# Altium footprint library ICs And Semiconductors SMD.PcbLib: 602 footprints (part 3 of 38)
Each footprint in its own frame and in the unit in brackets; x right, y up, seen from the top. Pads: shape width x height; smd on the part's side, far side on the other; paste and mask are expansions set on the pad; w line width, h text height; cw(c..) or ccw(c..) is an arc to the next point about the centre after c.
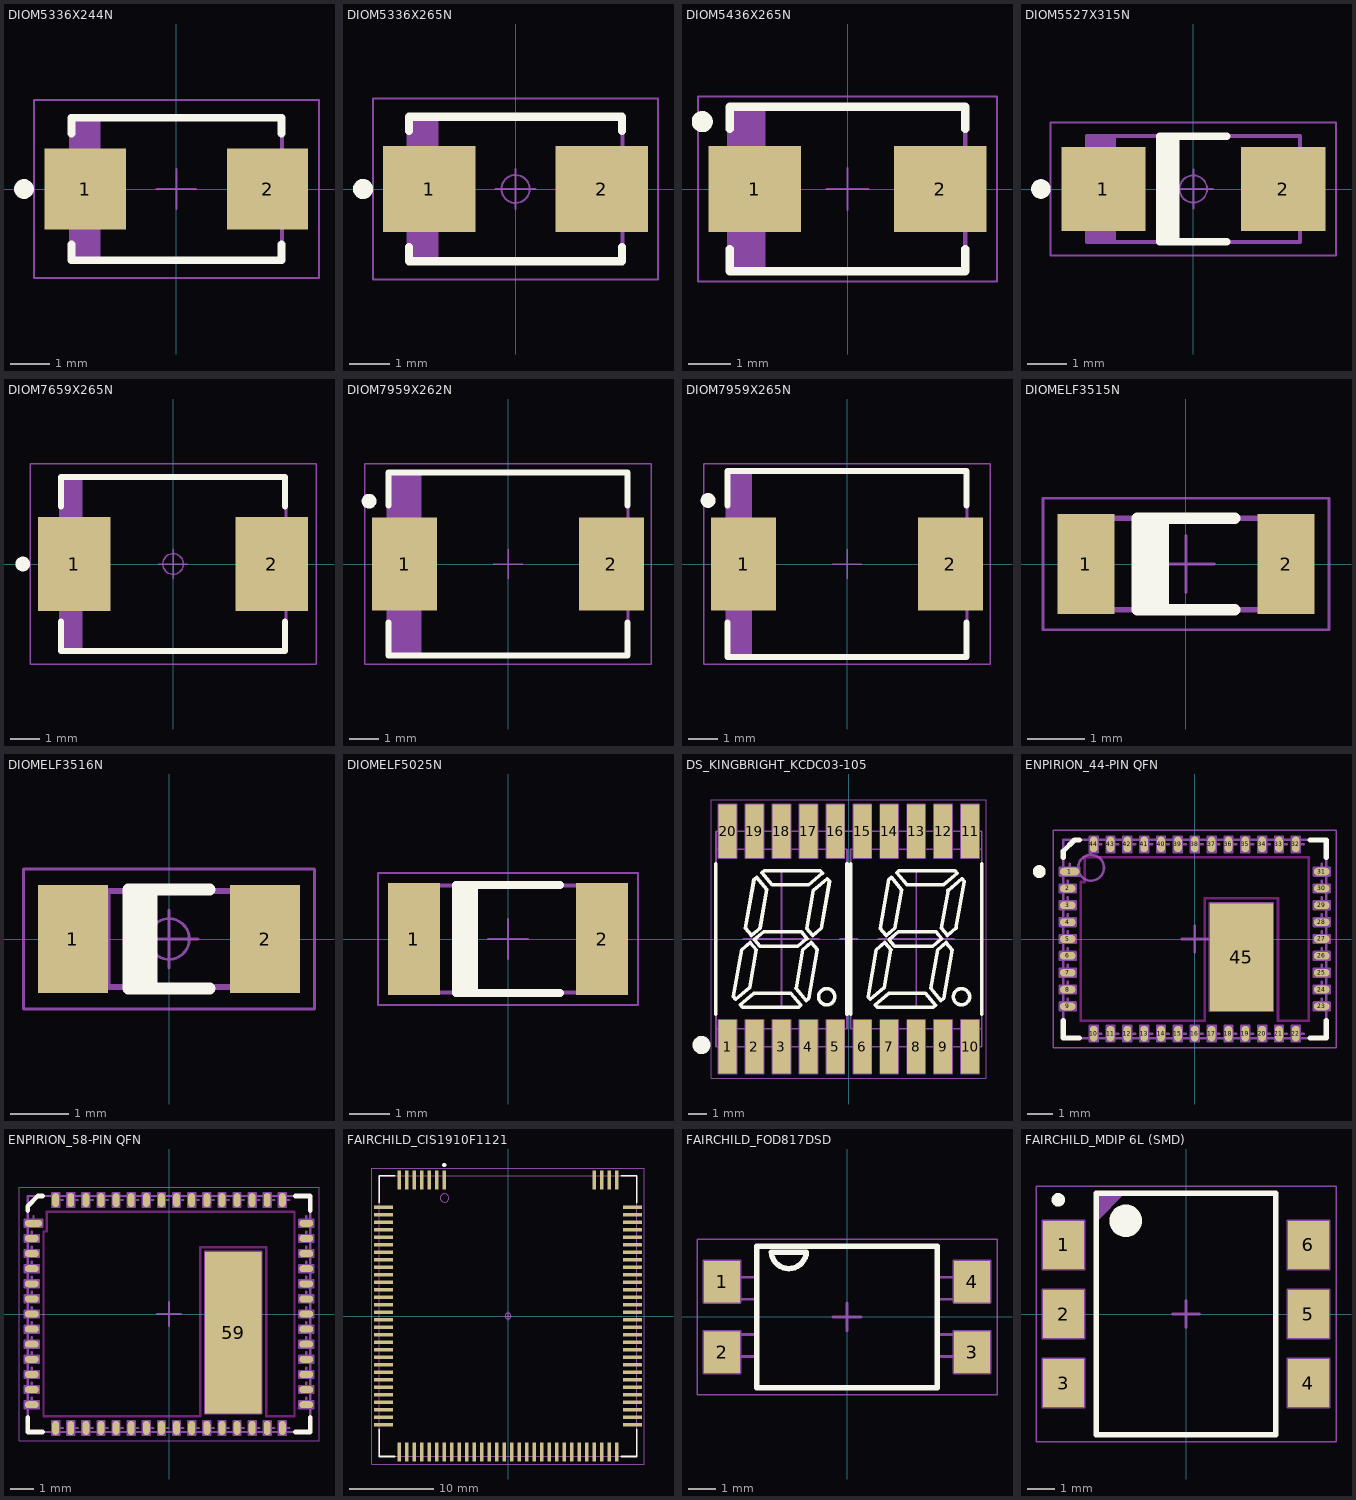
[diagram p2: the footprints below, top view; thin cyan lines are the x and y axes]

## DIOM5336X244N [mm] "DO-214-AA/SMB Molded Diode, 2-Leads, Body 5.3x3.6mm, IPC Medium Density"
height 2.44
pads (2):
  rect 2.05x2.05 smd: 1(-2.3,0) 2(2.3,0)
Top Overlay:
  circle w0.25: c-3.85,0 r0.125
  lines w0.2: -2.65,-1.4 -2.65,-1.8 2.65,-1.8 2.65,-1.4 ; -2.65,1.4 -2.65,1.8 2.65,1.8 2.65,1.4
Mechanical 14:
  lines w0.1: -2.568,-1.81 -2.568,1.81 ; -2.468,-1.81 -2.468,1.81 ; -2.368,-1.81 -2.368,1.81 ; -2.268,-1.81 -2.268,1.81 ; -2.168,-1.81 -2.168,1.81 ; -2.068,-1.81 -2.068,1.81 ; -1.968,-1.81 -1.968,1.81 ; -2.668,-1.81 2.668,-1.81 2.668,1.81 -2.668,1.81 -2.668,-1.81
Mechanical 15:
  lines w0.05: -0.5,0 0.5,0 ; 0,-0.5 0,0.5 ; -3.6,-2.25 3.6,-2.25 3.6,2.25 -3.6,2.25 -3.6,-2.25
3D body "DIOM5336X244N.stp": height 2.44, standoff 0, extent -2.7,-1.95 2.7,1.95

## DIOM5336X265N [mm] "DO-214-AA/SMB Diode, Molded Body; 5.34mm L X 3.625mm W X 2.65mm H, IPC Medium Density"
height 2.65
pads (2):
  rect 2.3x2.15 smd: 1(-2.15,0) 2(2.15,0)
Top Overlay:
  circle w0.25: c-3.8,0 r0.125
  lines w0.2: -2.65,-1.45 -2.65,-1.8 2.65,-1.8 2.65,-1.45 ; -2.65,1.45 -2.65,1.8 2.65,1.8 2.65,1.45
Mechanical 14:
  lines w0.1: -2.57,-1.812 -2.57,1.812 ; -2.47,-1.812 -2.47,1.812 ; -2.37,-1.812 -2.37,1.812 ; -2.27,-1.812 -2.27,1.812 ; -2.17,-1.812 -2.17,1.812 ; -2.07,-1.812 -2.07,1.812 ; -1.97,-1.812 -1.97,1.812 ; -2.67,-1.812 2.67,-1.812 2.67,1.812 -2.67,1.812 ; -2.67,-1.812 -2.67,1.812 ; -2.67,-1.812 -2.67,1.812
Mechanical 15:
  circle w0.05: c0,0 r0.35
  lines w0.05: -0.5,0 0.5,0 ; 0,-0.5 0,0.5 ; -3.55,-2.25 3.55,-2.25 3.55,2.25 -3.55,2.25 -3.55,-2.25
3D body "DIOM5336X240N.stp": height 2.4, standoff 0, extent -2.7,-1.95 2.7,1.95

## DIOM5436X265N [mm] "DO-214-AA/SMB Molded Diode, Body 5.4x3.6mm, IPC Medium Density"
height 2.65
pads (2):
  rect 2.2x2.05 smd: 1(-2.2,0) 2(2.2,0)
Top Overlay:
  circle w0.25: c-3.45,1.6 r0.125
  lines w0.2: -2.8,-1.425 -2.8,-1.95 2.8,-1.95 2.8,-1.425 ; -2.8,1.425 -2.8,1.95 2.8,1.95 2.8,1.425
Mechanical 13:
  lines w0.001: -2.845,-1.97 -2.845,1.97 2.845,1.97 2.845,-1.97 -2.845,-1.97 ; -2.795,-1.95 2.795,-1.95 2.795,1.95 -2.795,1.95 -2.795,-1.95
Mechanical 14:
  lines w0.1: -2.695,-1.95 -2.695,1.95 ; -2.595,-1.95 -2.595,1.95 ; -2.495,-1.95 -2.495,1.95 ; -2.395,-1.95 -2.395,1.95 ; -2.295,-1.95 -2.295,1.95 ; -2.195,-1.95 -2.195,1.95 ; -2.095,-1.95 -2.095,1.95 ; -1.995,-1.95 -1.995,1.95 ; -2.795,-1.95 2.795,-1.95 2.795,1.95 -2.795,1.95 -2.795,-1.95
Mechanical 15:
  lines w0.05: -0.5,0 0.5,0 ; 0,-0.5 0,0.5 ; -3.55,-2.2 3.55,-2.2 3.55,2.2 -3.55,2.2 -3.55,-2.2
3D body "DIOM5436X265N.stp": height 2.65, standoff 0, extent -2.8,-1.95 2.8,1.95

## DIOM5527X315N [mm] "DO-214-AC/SMB Diode, Molded Body; 5.45mm L X 2.705mm W X 3.15mm H, IPC Medium Density"
height 3.15
pads (2):
  rect 2.15x2.15 smd: 1(-2.3,0) 2(2.3,0)
Top Overlay:
  circle w0.25: c-3.9,0 r0.125
  lines w0.2: -0.65,-1.35 -0.65,1.35 ; -0.45,-1.35 -0.45,1.35 ; 0.85,-1.35 -0.85,-1.35 -0.85,1.35 0.85,1.35
Mechanical 14:
  lines w0.1: -2.625,-1.352 -2.625,1.352 ; -2.525,-1.352 -2.525,1.352 ; -2.425,-1.352 -2.425,1.352 ; -2.325,-1.352 -2.325,1.352 ; -2.225,-1.352 -2.225,1.352 ; -2.125,-1.352 -2.125,1.352 ; -2.025,-1.352 -2.025,1.352 ; -2.725,-1.352 -2.725,1.352 ; -2.725,-1.352 -2.725,1.352 ; -2.725,-1.352 2.725,-1.352 2.725,1.352 -2.725,1.352
Mechanical 15:
  circle w0.05: c0,0 r0.35
  lines w0.05: -0.5,0 0.5,0 ; 0,-0.5 0,0.5 ; -3.65,-1.7 -3.65,1.7 3.65,1.7 3.65,-1.7 -3.65,-1.7
3D body "DIOM5527X315N.stp": height 3.15, standoff 0, extent -2.845,-1.42 2.845,1.42

## DIOM7659X265N [mm] "DO-214-AB/SMC Molded Diode, Body 7.95x5.9mm, IPC Medium Density"
height 2.65
pads (2):
  rect 2.45x3.2 smd: 1(-3.35,0) 2(3.35,0)
Top Overlay:
  circle w0.25: c-5.1,0 r0.125
  lines w0.2: -3.8,-1.95 -3.8,-2.95 3.8,-2.95 3.8,-1.95 ; -3.8,1.95 -3.8,2.95 3.8,2.95 3.8,1.95
Mechanical 14:
  lines w0.1: -3.725,-2.95 -3.725,2.95 ; -3.625,-2.95 -3.625,2.95 ; -3.525,-2.95 -3.525,2.95 ; -3.425,-2.95 -3.425,2.95 ; -3.325,-2.95 -3.325,2.95 ; -3.225,-2.95 -3.225,2.95 ; -3.125,-2.95 -3.125,2.95 ; -3.825,-2.95 -3.825,2.95 3.825,2.95 3.825,-2.95 -3.825,-2.95
Mechanical 15:
  circle w0.05: c0,0 r0.35
  lines w0.05: -0.5,0 0.5,0 ; 0,-0.5 0,0.5 ; -4.85,-3.4 -4.85,3.4 4.85,3.4 4.85,-3.4 -4.85,-3.4
3D body "DIOM7659X265N.stp": height 2.65, standoff 0, extent -3.975,-2.95 3.975,2.95

## DIOM7959X262N [mm] "DO-214-AB/SMC Molded Diode, Body 7.9x5.9mm, IPC Medium Density"
height 2.62
pads (2):
  rect 2.2x3.15 smd: 1(-3.5,0) 2(3.5,0)
Top Overlay:
  circle w0.25: c-4.7,2.125 r0.125
  lines w0.2: -4.05,-1.975 -4.05,-3.1 4.05,-3.1 4.05,-1.975 ; -4.05,1.975 -4.05,3.1 4.05,3.1 4.05,1.975
Mechanical 14:
  lines w0.1: -4,-3.11 -4,3.11 ; -3.95,-3.11 -3.95,3.11 ; -3.875,-3.11 -3.875,3.11 ; -3.8,-3.11 -3.8,3.11 ; -3.725,-3.11 -3.725,3.11 ; -3.65,-3.11 -3.65,3.11 ; -3.575,-3.11 -3.575,3.11 ; -3.5,-3.11 -3.5,3.11 ; -3.425,-3.11 -3.425,3.11 ; -3.35,-3.11 -3.35,3.11 ; -3.275,-3.11 -3.275,3.11 ; -3.2,-3.11 -3.2,3.11 ; -3.125,-3.11 -3.125,3.11 ; -3.05,-3.11 -3.05,3.11 ; -2.975,-3.11 -2.975,3.11 ; -4.065,-3.11 -4.065,3.11 4.065,3.11 4.065,-3.11 -4.065,-3.11
Mechanical 15:
  lines w0.05: -0.5,0 0.5,0 ; 0,-0.5 0,0.5 ; -4.85,-3.4 -4.85,3.4 4.85,3.4 4.85,-3.4 -4.85,-3.4
3D body "DIOM7959X262N.stp": height 2.62, standoff 0, extent -4.065,-3.11 4.065,3.11

## DIOM7959X265N [mm] "DO-214-AB/SMC Molded Diode, Body 7.9x5.9mm, IPC Medium Density"
height 2.65
pads (2):
  rect 2.2x3.15 smd: 1(-3.5,0) 2(3.5,0)
Top Overlay:
  circle w0.25: c-4.7,2.15 r0.125
  lines w0.2: -4.05,-1.975 -4.05,-3.15 4.05,-3.15 4.05,-1.975 ; -4.05,1.975 -4.05,3.15 4.05,3.15 4.05,1.975
Mechanical 13:
  lines w0.001: -4.065,-3.15 4.065,-3.15 4.065,3.15 -4.065,3.15 -4.065,-3.15
Mechanical 14:
  lines w0.1: -3.965,-3.15 -3.965,3.15 ; -3.865,-3.15 -3.865,3.15 ; -3.765,-3.15 -3.765,3.15 ; -3.665,-3.15 -3.665,3.15 ; -3.565,-3.15 -3.565,3.15 ; -3.465,-3.15 -3.465,3.15 ; -3.365,-3.15 -3.365,3.15 ; -3.265,-3.15 -3.265,3.15 ; -4.065,-3.15 4.065,-3.15 4.065,3.15 -4.065,3.15 -4.065,-3.15
Mechanical 15:
  lines w0.05: -0.5,0 0.5,0 ; 0,-0.5 0,0.5 ; -4.85,-3.4 4.85,-3.4 4.85,3.4 -4.85,3.4 -4.85,-3.4
3D body "DIOM7959X265N.stp": height 2.65, standoff 0, extent -4.065,-3.11 4.065,3.11

## DIOMELF3515N [mm] "SOD80C, MELF Diode, 2-Leads, Body 3.5x1.5mm, IPC Medium Density"
height 1.6
pads (2):
  rect 1x1.75 smd: 1(-1.75,0) 2(1.75,0)
Top Overlay:
  rectangle: -0.85,-0.8 -0.3,0.8
  lines w0.2: 0.85,-0.8 -0.85,-0.8 -0.85,0.8 0.85,0.8
Mechanical 14:
  lines w0.1: -1.802,-0.8 -1.802,0.8 ; -1.727,-0.8 -1.727,0.8 ; -1.652,-0.8 -1.652,0.8 ; -1.577,-0.8 -1.577,0.8 ; -1.502,-0.8 -1.502,0.8 ; -1.427,-0.8 -1.427,0.8 ; -1.352,-0.8 -1.352,0.8 ; -1.85,-0.8 1.85,-0.8 1.85,0.8 -1.85,0.8 -1.85,-0.8
Mechanical 15:
  lines w0.05: -0.5,0 0.5,0 ; 0,-0.5 0,0.5 ; -2.5,-1.15 2.5,-1.15 2.5,1.15 -2.5,1.15 -2.5,-1.15
3D body "DIOMELF3515N.stp": height 1.6, standoff 0, extent -1.85,-0.8 1.85,0.8

## DIOMELF3516N [mm] "SOD80, Diode, MELF; 3.50mm L X 1.65mm Dia, IPC Medium Density"
height 1.6
pads (2):
  rect 1.2x1.85 smd: 1(-1.65,0) 2(1.65,0)
Top Overlay:
  lines w0.2: -0.5,-0.85 -0.5,0.85 ; -0.3,-0.85 -0.3,0.85 ; 0.7,-0.85 -0.7,-0.85 -0.7,0.85 0.7,0.85
Mechanical 14:
  lines w0.1: -1.65,-0.825 -1.65,0.825 ; -1.55,-0.825 -1.55,0.825 ; -1.45,-0.825 -1.45,0.825 ; -1.35,-0.825 -1.35,0.825 ; -1.25,-0.825 -1.25,0.825 ; -1.15,-0.825 -1.15,0.825 ; -1.05,-0.825 -1.05,0.825 ; -1.75,-0.825 -1.75,0.825 ; -1.75,-0.825 -1.75,0.825 ; -1.75,-0.825 1.75,-0.825 1.75,0.825 -1.75,0.825
Mechanical 15:
  circle w0.05: c0,0 r0.35
  lines w0.05: -0.5,0 0.5,0 ; 0,-0.5 0,0.5 ; -2.5,-1.2 -2.5,1.2 2.5,1.2 2.5,-1.2 -2.5,-1.2
Mechanical 21:
  lines w0.001: -1.85,-0.85 -1.85,0.85 1.85,0.85 1.85,-0.85 -1.85,-0.85
3D body "DIOMELF3516N.stp": height 1.7, standoff 0, extent -1.85,-0.8 1.65,0.9

## DIOMELF5025N [mm] "DO-213-AB, MELF Diode, 2-Leads, Body 5.0x2.5mm, IPC Medium Density"
height 2.7
pads (2):
  rect 1.3x2.8 smd: 1(-2.35,0) 2(2.35,0)
Top Overlay:
  rectangle: -1.3,-1.35 -0.75,1.35
  lines w0.2: 1.3,-1.35 -1.3,-1.35 -1.3,1.35 1.3,1.35
Mechanical 14:
  lines w0.1: -2.5,-1.335 -2.5,1.335 ; -2.4,-1.335 -2.4,1.335 ; -2.3,-1.335 -2.3,1.335 ; -2.2,-1.335 -2.2,1.335 ; -2.1,-1.335 -2.1,1.335 ; -2,-1.335 -2,1.335 ; -2.6,-1.335 -2.6,1.335 2.6,1.335 2.6,-1.335 -2.6,-1.335
Mechanical 15:
  lines w0.05: -0.5,0 0.5,0 ; 0,-0.5 0,0.5 ; -3.25,-1.65 -3.25,1.65 3.25,1.65 3.25,-1.65 -3.25,-1.65
3D body "DIOMELF5025N.stp": height 2.67, standoff 0, extent -2.6,-1.335 2.6,1.335

## DS_KINGBRIGHT_KCDC03-105 [mm] "20-Leads, Body 14.8x12mm, Pitch 1.5mm, Hyper Red SMD Common Cathode Dual 7-SegmentDisplay"
height 1.2
pads (20):
  rect 1x3 smd: 1(-6.75,-6) 2(-5.25,-6) 3(-3.75,-6) 4(-2.25,-6) 5(-0.75,-6) 6(0.75,-6) 7(2.25,-6) 8(3.75,-6) 9(5.25,-6) 10(6.75,-6) 11(6.75,6) 12(5.25,6) 13(3.75,6) 14(2.25,6) 15(0.75,6) 16(-0.75,6) 17(-2.25,6) 18(-3.75,6) 19(-5.25,6) 20(-6.75,6)
Top Overlay:
  circle w0.2: c-1.227,-3.215 r0.45
  circle w0.2: c6.273,-3.215 r0.45
  circle w0.5: c-8.2,-5.9 r0.25
  lines w0.2: -0.1,-4.2 -0.1,4.2 ; 0.1,-4.2 0.1,4.2 ; -7.4,-4.2 -7.4,4.2 ; -7.4,-4.2 -7.4,4.2 ; -7.4,-4.2 -7.4,4.2 ; 7.4,-4.2 7.4,4.2 ; 7.4,-4.2 7.4,4.2 ; 7.4,-4.2 7.4,4.2 ; -6.425,-3.206 -6.301,-3.354 -5.524,-2.703 -5.153,-0.597 -5.489,-0.197 -5.965,-0.597 -6.425,-3.206 ; -6.034,-3.662 -5.909,-3.81 -2.815,-3.81 -2.667,-3.686 -3.233,-3.01 -5.257,-3.01 -6.034,-3.662 ; -5.755,0.597 -5.278,3.303 -5.129,3.428 -4.562,2.752 -4.942,0.597 -5.419,0.197 -5.755,0.597 ; -5.257,-0.035 -4.739,0.4 -2.643,0.4 -2.328,0.025 -2.834,-0.4 -4.95,-0.4 -5.257,-0.035 ; -4.833,3.686 -4.685,3.81 -1.591,3.81 -1.466,3.662 -2.243,3.01 -4.266,3.01 -4.833,3.686 ; -2.938,-2.752 -2.37,-3.428 -2.223,-3.304 -1.745,-0.597 -2.081,-0.197 -2.558,-0.597 -2.938,-2.752 ; -2.347,0.597 -1.976,2.703 -1.199,3.354 -1.075,3.206 -1.535,0.597 -2.011,0.197 -2.347,0.597 ; 1.075,-3.206 1.199,-3.354 1.976,-2.703 2.347,-0.597 2.011,-0.197 1.535,-0.597 1.075,-3.206 ; 1.466,-3.662 1.591,-3.81 4.685,-3.81 4.833,-3.686 4.267,-3.01 2.243,-3.01 1.466,-3.662 ; 1.745,0.597 2.222,3.303 2.371,3.428 2.938,2.752 2.558,0.597 2.081,0.197 1.745,0.597 ; 2.243,-0.035 2.761,0.4 4.857,0.4 5.172,0.025 4.666,-0.4 2.55,-0.4 2.243,-0.035 ; 2.667,3.686 2.815,3.81 5.909,3.81 6.034,3.662 5.257,3.01 3.234,3.01 2.667,3.686 ; 4.562,-2.752 5.13,-3.428 5.277,-3.304 5.755,-0.597 5.419,-0.197 4.942,-0.597 4.562,-2.752 ; 5.153,0.597 5.524,2.703 6.301,3.354 6.425,3.206 5.965,0.597 5.489,0.197 5.153,0.597
Mechanical 8:
  drawing of 172 lines, arcs and shapes, not listed
Mechanical 14:
  drawing of 422 lines, arcs and shapes, not listed
Mechanical 15:
  lines w0.05: -7.65,-7.75 -7.65,7.75 7.65,7.75 7.65,-7.75 -7.65,-7.75
3D body "DS_KINGBRIGHT_KCDC03-105.stp": height 3.75, standoff 0, extent -7.4,-6 7.4,6

## ENPIRION_44-PIN QFN [mm] "QFN, 0.65mm pitch, square; 44 pin, 10mm L X 7.5mm W X 1.9mm H body (w/thermal tab 2.425mm x 4.15mm), IPC Medium Density"
height 1.9
pads (45):
  oval 0.75x0.3 smd: 1(-4.825,2.6)
  oval 0.6x0.3 smd: 2(-4.9,1.95) 3(-4.9,1.3) 4(-4.9,0.65) 5(-4.9,0) 6(-4.9,-0.65) 7(-4.9,-1.3) 8(-4.9,-1.95) 9(-4.9,-2.6) 23(4.9,-2.6) 24(4.9,-1.95) 25(4.9,-1.3) 26(4.9,-0.65) 27(4.9,0) 28(4.9,0.65) 29(4.9,1.3) 30(4.9,1.95) 31(4.9,2.6)
  oval 0.3x0.6 smd: 10(-3.9,-3.65) 11(-3.25,-3.65) 12(-2.6,-3.65) 13(-1.95,-3.65) 14(-1.3,-3.65) 15(-0.65,-3.65) 16(0,-3.65) 17(0.65,-3.65) 18(1.3,-3.65) 19(1.95,-3.65) 20(2.6,-3.65) 21(3.25,-3.65) 22(3.9,-3.65) 32(3.9,3.65) 33(3.25,3.65) 34(2.6,3.65) 35(1.95,3.65) 36(1.3,3.65) 37(0.65,3.65) 38(0,3.65) 39(-0.65,3.65) 40(-1.3,3.65) 41(-1.95,3.65) 42(-2.6,3.65) 43(-3.25,3.65) 44(-3.9,3.65)
  rect 2.425x4.15 smd: 45(1.801,-0.7)
Top Layer keep-out:
  lines w0.1: -4.4,-3.15 -4.4,2.2 -4.25,2.2 -4.25,3.15 4.4,3.15 4.4,-3.15 3.213,-3.15 3.213,1.575 0.388,1.575 0.388,-3.15 -4.4,-3.15
Top Overlay:
  circle w0.25: c-6,2.6 r0.125
  lines w0.2: -5.075,-3.225 -5.075,-3.825 ; -5.075,-3.15 -5.075,-3.825 ; -5.075,3.15 -5.075,3.385 ; -5.075,3.225 -5.075,3.385 ; -4.45,-3.825 -5.075,-3.825 ; -4.45,3.825 -4.635,3.825 -5.075,3.385 ; 4.45,-3.825 5.075,-3.825 5.075,-3.15 ; 4.45,3.825 5.075,3.825 5.075,3.15
Mechanical 8:
  drawing of 278 lines, arcs and shapes, not listed
Mechanical 14:
  circle w0.1: c-4,2.75 r0.5
  lines w0.1: -5.075,-3.825 -5.075,3.825 5.075,3.825 5.075,-3.825 -5.075,-3.825
Mechanical 15:
  lines w0.05: -5.45,-4.2 5.45,-4.2 5.45,4.2 -5.45,4.2 -5.45,-4.2
3D body "ENPIRION_44-PIN QFN.stp": height 1.9, standoff 0, extent -5.075,-3.825 5.075,3.825

## ENPIRION_58-PIN QFN [mm] "QFN, 0.65mm pitch, square; 58 pin, 12mm L X 10mm W X 1.95mm H body (w/thermal tab 6.955mm x 4.425mm), IPC Medium Density"
height 1.95
pads (59):
  oval 0.75x0.3 smd: 1(-5.825,3.9)
  oval 0.6x0.3 smd: 2(-5.9,3.25) 3(-5.9,2.6) 4(-5.9,1.95) 5(-5.9,1.3) 6(-5.9,0.65) 7(-5.9,0) 8(-5.9,-0.65) 9(-5.9,-1.3) 10(-5.9,-1.95) 11(-5.9,-2.6) 12(-5.9,-3.25) 13(-5.9,-3.9) 30(5.9,-3.9) 31(5.9,-3.25) 32(5.9,-2.6) 33(5.9,-1.95) 34(5.9,-1.3) 35(5.9,-0.65) 36(5.9,0) 37(5.9,0.65) 38(5.9,1.3) 39(5.9,1.95) 40(5.9,2.6) 41(5.9,3.25) 42(5.9,3.9)
  oval 0.3x0.6 smd: 14(-4.875,-4.9) 15(-4.225,-4.9) 16(-3.575,-4.9) 17(-2.925,-4.9) 18(-2.275,-4.9) 19(-1.625,-4.9) 20(-0.975,-4.9) 21(-0.325,-4.9) 22(0.325,-4.9) 23(0.975,-4.9) 24(1.625,-4.9) 25(2.275,-4.9) 26(2.925,-4.9) 27(3.575,-4.9) 28(4.225,-4.9) 29(4.875,-4.9) 43(4.875,4.9) 44(4.225,4.9) 45(3.575,4.9) 46(2.925,4.9) 47(2.275,4.9) 48(1.625,4.9) 49(0.975,4.9) 50(0.325,4.9) 51(-0.325,4.9) 52(-0.975,4.9) 53(-1.625,4.9) 54(-2.275,4.9) 55(-2.925,4.9) 56(-3.575,4.9) 57(-4.225,4.9) 58(-4.875,4.9)
  rect 2.425x6.95 smd: 59(2.763,-0.8)
Top Layer keep-out:
  lines w0.1: -5.4,-4.4 -5.4,3.55 -5.25,3.55 -5.25,4.4 5.4,4.4 5.4,-4.4 4.175,-4.4 4.175,2.875 1.35,2.875 1.35,-4.4 -5.4,-4.4
Top Overlay:
  lines w0.2: -6.075,-4.45 -6.075,-5.075 -5.425,-5.075 ; -6.075,4.45 -6.075,4.635 -5.635,5.075 -5.425,5.075 ; 5.425,-5.075 6.075,-5.075 6.075,-4.45 ; 5.425,5.075 6.075,5.075 6.075,4.45
Top Paste:
  region: 2.183,0.45 3.343,0.45 3.343,2.35 2.183,2.35
  region: 2.183,-1.75 3.343,-1.75 3.343,0.15 2.183,0.15
  region: 2.183,-3.95 3.343,-3.95 3.343,-2.05 2.183,-2.05
Mechanical 8:
  drawing of 360 lines, arcs and shapes, not listed
Mechanical 14:
  lines w0.1: -6.075,-5.075 6.075,-5.075 6.075,5.075 -6.075,5.075 -6.075,-5.075
Mechanical 15:
  lines w0.05: -6.45,-5.45 -6.45,5.45 6.45,5.45 6.45,-5.45 -6.45,-5.45
3D body "ENPIRION_58-PIN QFN.stp": height 1.95, standoff 0, extent -6.075,-5.075 6.075,5.075

## FAIRCHILD_CIS1910F1121 [mm] "LCC, 0.889mm Pitch, Rect.; 101 Pin, 33.274mm L X 30.48mm W X 3.35mm H Body, FAIRCHILD LCC101"
height 4.11
pads (101):
  rect 0.4x2.25 smd: 1(-7.556,16.15) 2(-8.445,16.15) 3(-9.335,16.15) 4(-10.223,16.15) 5(-11.112,16.15) 6(-12.002,16.15) 7(-12.89,16.15) 38(-12.89,-16.15) 39(-12.002,-16.15) 40(-11.112,-16.15) 41(-10.223,-16.15) 42(-9.335,-16.15) 43(-8.445,-16.15) 44(-7.556,-16.15) 45(-6.667,-16.15) 46(-5.779,-16.15) 47(-4.889,-16.15) 48(-4,-16.15) 49(-3.111,-16.15) 50(-2.222,-16.15) 51(-1.333,-16.15) 52(-0.445,-16.15) 53(0.445,-16.15) 54(1.333,-16.15) 55(2.222,-16.15) 56(3.111,-16.15) 57(4,-16.15) 58(4.889,-16.15) 59(5.779,-16.15) 60(6.667,-16.15) 61(7.556,-16.15) 62(8.445,-16.15) 63(9.335,-16.15) 64(10.223,-16.15) 65(11.112,-16.15) 66(12.002,-16.15) 67(12.89,-16.15) 98(12.89,16.15) 99(12.002,16.15) 100(11.112,16.15) 101(10.223,16.15)
  rect 2.25x0.4 smd: 8(-14.75,12.89) 9(-14.75,12.002) 10(-14.75,11.112) 11(-14.75,10.223) 12(-14.75,9.335) 13(-14.75,8.445) 14(-14.75,7.556) 15(-14.75,6.667) 16(-14.75,5.779) 17(-14.75,4.889) 18(-14.75,4) 19(-14.75,3.111) 20(-14.75,2.222) 21(-14.75,1.333) 22(-14.75,0.445) 23(-14.75,-0.445) 24(-14.75,-1.333) 25(-14.75,-2.222) 26(-14.75,-3.111) 27(-14.75,-4) 28(-14.75,-4.889) 29(-14.75,-5.779) 30(-14.75,-6.667) 31(-14.75,-7.556) 32(-14.75,-8.445) 33(-14.75,-9.335) 34(-14.75,-10.223) 35(-14.75,-11.112) 36(-14.75,-12.002) 37(-14.75,-12.89) 68(14.75,-12.89) 69(14.75,-12.002) 70(14.75,-11.112) 71(14.75,-10.223) 72(14.75,-9.335) 73(14.75,-8.445) 74(14.75,-7.556) 75(14.75,-6.667) 76(14.75,-5.779) 77(14.75,-4.889) 78(14.75,-4) 79(14.75,-3.111) 80(14.75,-2.222) 81(14.75,-1.333) 82(14.75,-0.445) 83(14.75,0.445) 84(14.75,1.333) 85(14.75,2.222) 86(14.75,3.111) 87(14.75,4) 88(14.75,4.889) 89(14.75,5.779) 90(14.75,6.667) 91(14.75,7.556) 92(14.75,8.445) 93(14.75,9.335) 94(14.75,10.223) 95(14.75,11.112) 96(14.75,12.002) 97(14.75,12.89)
Top Overlay:
  circle w0.25: c-7.557,17.9 r0.125
  lines w0.2: -15.25,-13.45 -15.25,-16.65 -13.45,-16.65 ; -15.25,13.45 -15.25,16.65 -13.45,16.65 ; 13.45,-16.65 15.25,-16.65 15.25,-13.45 ; 13.45,16.65 15.25,16.65 15.25,13.45
Mechanical 14:
  circle w0.1: c-7.525,14 r0.5
  lines w0.1: -15.24,-16.637 -15.24,16.637 15.24,16.637 15.24,-16.637 -15.24,-16.637
Mechanical 15:
  circle w0.05: c0,0 r0.35
  lines w0.05: -0.5,0 0.5,0 ; 0,-0.5 0,0.5 ; -16.15,-17.55 -16.15,17.55 16.15,17.55 16.15,-17.55 -16.15,-17.55
3D body "FAIRCHILD_CIS1910F1121_Part2.stp": height 4.29, standoff 3.3, extent -12.662,-9.068 12.662,14.402
3D body "FAIRCHILD_CIS1910F1121_Part1.stp": height 3.35, standoff 0, extent -15.24,-16.637 15.24,16.637

## FAIRCHILD_FOD817DSD [mm] "SOIC, 2.54mm Pitch, 4 Pin, Body 6.5mm W X 4.6mm L X 4.6mm H"
height 5.08
pads (4):
  rect 1.3x1.5 smd: 1(-4.5,1.27) 2(-4.5,-1.27) 3(4.5,-1.27) 4(4.5,1.27)
Top Overlay:
  lines w0.2: -3.25,-2.55 -3.25,2.55 3.25,2.55 3.25,-2.55 -3.25,-2.55 ; -2.728,2.334 ccw(c-2.094,2.374) -1.46,2.334 -2.728,2.334
Mechanical 8:
  lines w0.1: -5,-1.27 -4.5,-1.27 ; -5,1.27 -4.5,1.27 ; -4.5,-1.77 -4.5,-1.27 ; -4.5,-0.77 -4.5,-1.27 ; -4.5,0.77 -4.5,1.27 ; -4.5,1.77 -4.5,1.27 ; -4,-1.27 -4.5,-1.27 ; -4,1.27 -4.5,1.27 ; -0.5,0 0,0 ; 0,-0.5 0,0 ; 0,0.5 0,0 ; 0.5,0 0,0 ; 4,-1.27 4.5,-1.27 ; 4,1.27 4.5,1.27 ; 4.5,-1.77 4.5,-1.27 ; 4.5,-0.77 4.5,-1.27 ; 4.5,0.77 4.5,1.27 ; 4.5,1.77 4.5,1.27 ; 5,-1.27 4.5,-1.27 ; 5,1.27 4.5,1.27 ; -5.15,-2.02 -3.85,-2.02 -3.85,-0.52 -5.15,-0.52 -5.15,-2.02 ; -5.15,0.52 -3.85,0.52 -3.85,2.02 -5.15,2.02 -5.15,0.52 ; 3.85,-2.02 5.15,-2.02 5.15,-0.52 3.85,-0.52 3.85,-2.02 ; 3.85,0.52 5.15,0.52 5.15,2.02 3.85,2.02 3.85,0.52
Mechanical 14:
  lines w0.1: -3.25,-1.425 -3.855,-1.425 -3.855,-1.905 -5.015,-1.905 -5.015,-0.635 -3.25,-0.635 ; -3.25,0.635 -5.015,0.635 -5.015,1.905 -3.855,1.905 -3.855,1.425 -3.25,1.425 ; 3.25,-1.425 3.855,-1.425 3.85,-1.905 5.015,-1.905 5.015,-0.635 3.25,-0.635 ; 3.25,0.635 5.015,0.635 5.015,1.905 3.855,1.905 3.855,1.425 3.25,1.425 ; -3.25,-2.55 -3.25,2.55 3.25,2.55 3.25,-2.55 -3.25,-2.55 ; -2.728,2.334 ccw(c-2.094,2.374) -1.46,2.334 -2.728,2.334
Mechanical 15:
  lines w0.05: -5.4,-2.8 -5.4,2.8 5.4,2.8 5.4,-2.8 -5.4,-2.8
3D body "FAIRCHILD_FOD817DSD.stp": height 4.06, standoff 0, extent -5.015,-2.55 5.015,2.55

## FAIRCHILD_MDIP 6L (SMD) [mm] "SOIC, 2.54mm Pitch, 6 Pin, Body 6.35mm W X 8.5mm L X 5.08mm H, FAIRCHILD MDIP 6L"
height 5.08
pads (6):
  rect 1.52x1.78 smd: 1(-4.508,2.54) 2(-4.508,0) 3(-4.508,-2.54) 4(4.508,-2.54) 5(4.508,0) 6(4.508,2.54)
Top Overlay:
  circle w0.6: c-2.22,3.43 r0.3
  circle w0.25: c-4.7,4.2 r0.125
  lines w0.2: -3.3,-4.445 3.3,-4.445 3.3,4.445 -3.3,4.445 -3.3,-4.445
Mechanical 8:
  lines w0.1: -5.008,-2.54 -4.508,-2.54 ; -5.008,0 -4.508,0 ; -5.008,2.54 -4.508,2.54 ; -4.508,-3.04 -4.508,-2.54 ; -4.508,-2.04 -4.508,-2.54 ; -4.508,-0.5 -4.508,0 ; -4.508,0.5 -4.508,0 ; -4.508,2.04 -4.508,2.54 ; -4.508,3.04 -4.508,2.54 ; -4.008,-2.54 -4.508,-2.54 ; -4.008,0 -4.508,0 ; -4.008,2.54 -4.508,2.54 ; -0.5,0 0,0 ; 0,-0.5 0,0 ; 0,0.5 0,0 ; 0.5,0 0,0 ; 4.008,-2.54 4.508,-2.54 ; 4.008,0 4.508,0 ; 4.008,2.54 4.508,2.54 ; 4.508,-3.04 4.508,-2.54 ; 4.508,-2.04 4.508,-2.54 ; 4.508,-0.5 4.508,0 ; 4.508,0.5 4.508,0 ; 4.508,2.04 4.508,2.54 ; 4.508,3.04 4.508,2.54 ; 5.008,-2.54 4.508,-2.54 ; 5.008,0 4.508,0 ; 5.008,2.54 4.508,2.54 ; -5.27,-3.43 -5.27,-1.65 -3.745,-1.65 -3.745,-3.43 -5.27,-3.43 ; -5.27,-0.89 -5.27,0.89 -3.745,0.89 -3.745,-0.89 -5.27,-0.89 ; -5.27,1.65 -5.27,3.43 -3.745,3.43 -3.745,1.65 -5.27,1.65 ; 3.745,-3.43 3.745,-1.65 5.27,-1.65 5.27,-3.43 3.745,-3.43 ; 3.745,-0.89 3.745,0.89 5.27,0.89 5.27,-0.89 3.745,-0.89 ; 3.745,1.65 3.745,3.43 5.27,3.43 5.27,1.65 3.745,1.65
Mechanical 14:
  lines w0.1: -3.3,3.445 -2.3,4.445 ; -3.3,3.545 -2.4,4.445 ; -3.3,3.645 -2.5,4.445 ; -3.3,3.745 -2.6,4.445 ; -3.3,3.845 -2.7,4.445 ; -3.3,3.945 -2.8,4.445 ; -3.3,4.045 -2.9,4.445 ; -3.3,4.145 -3,4.445 ; -3.3,4.245 -3.1,4.445 ; -3.3,4.345 -3.2,4.445 ; -3.3,-4.445 3.3,-4.445 3.3,4.445 -3.3,4.445 -3.3,-4.445
Mechanical 15:
  lines w0.05: -5.52,-4.695 5.52,-4.695 5.52,4.695 -5.52,4.695 -5.52,-4.695
3D body "FAIRCHILD_MDIP 6L (SMD).stp": height 5.08, standoff 0, extent -4.946,-4.445 4.947,4.445